# Altium footprint library Cyberdeck.PcbLib: 261 footprints (part 12 of 17)
Each footprint in its own frame and in the unit in brackets; x right, y up, seen from the top. Pads: shape width x height; smd on the part's side, far side on the other; paste and mask are expansions set on the pad; w line width, h text height; cw(c..) or ccw(c..) is an arc to the next point about the centre after c.
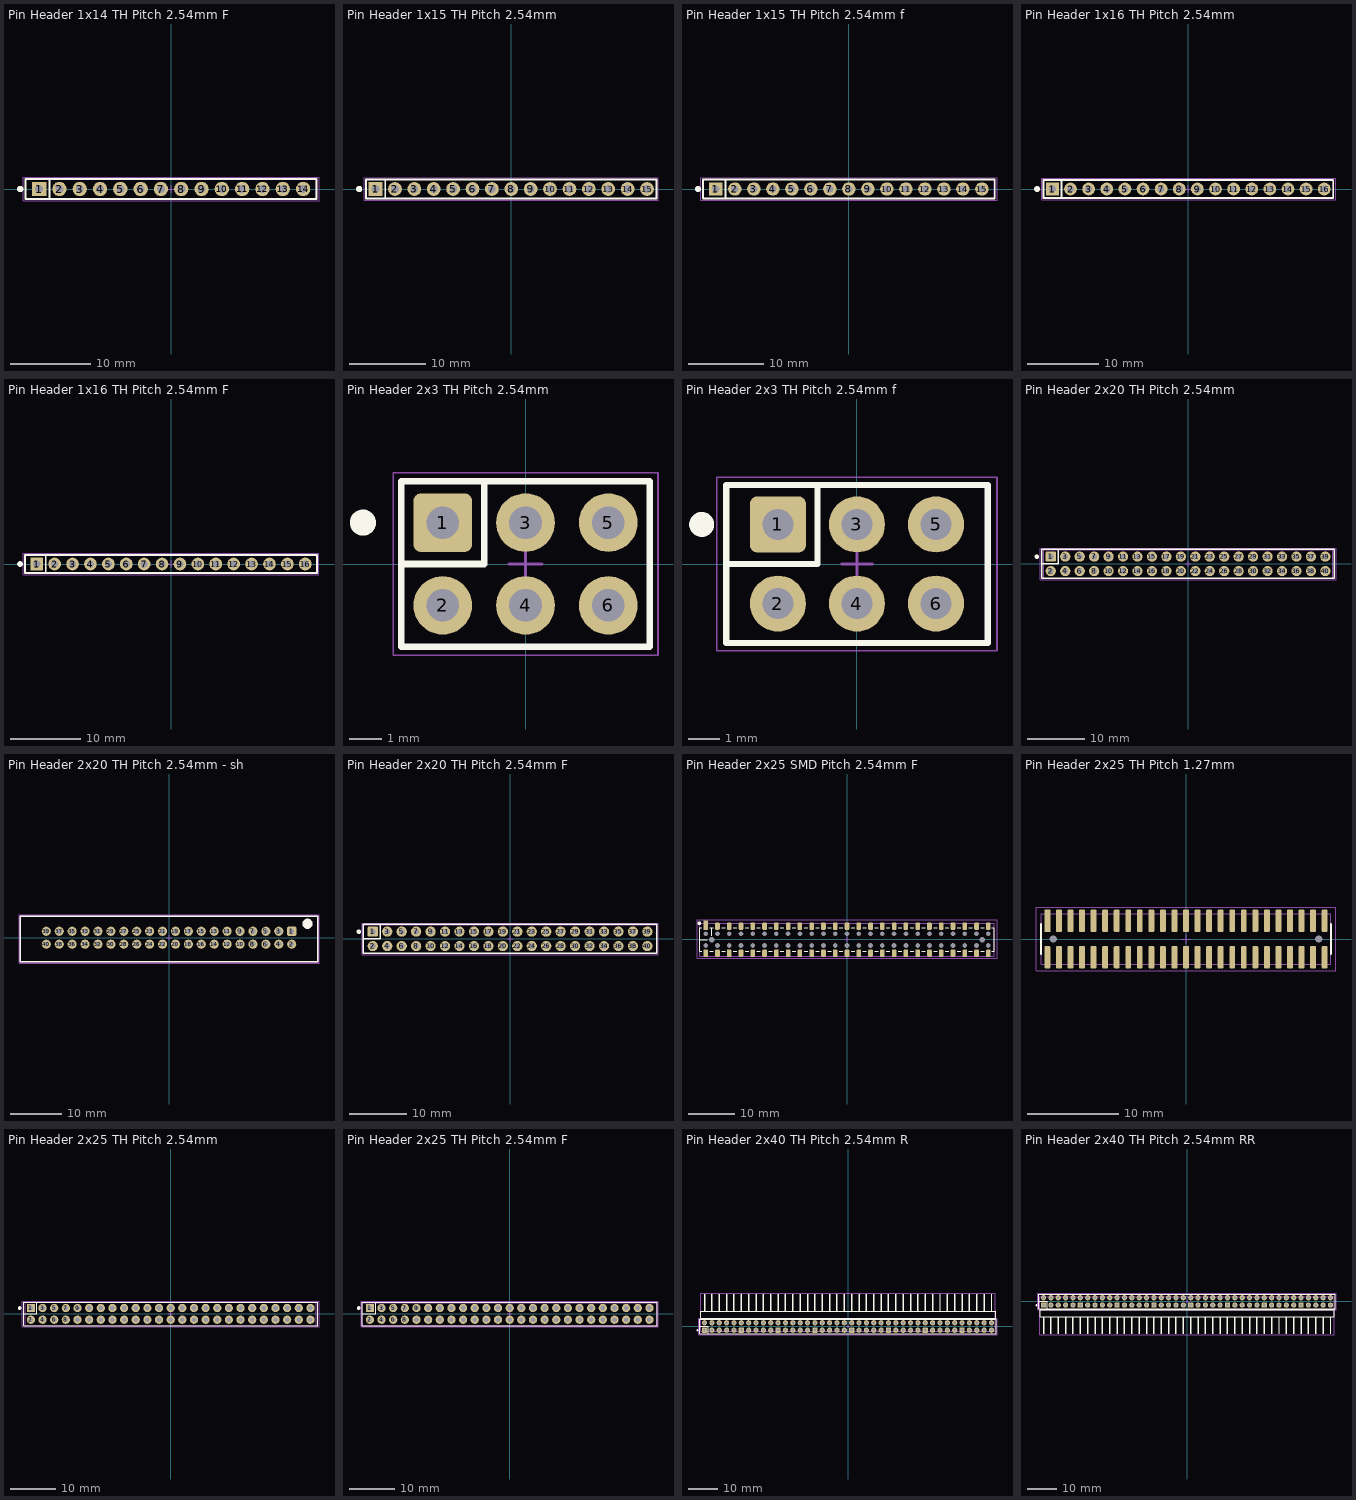
[diagram p11: the footprints below, top view; thin cyan lines are the x and y axes]

## Pin Header 1x14 TH Pitch 2.54mm F [mm] "PinHeader 1x14 TH Pitch 2.54mm female"
height 9.5
pads (14):
  rect 1.8x1.8 hole 1: 1(-16.51,0)
  round 1.8 hole 1: 2(-13.97,0) 3(-11.43,0) 4(-8.89,0) 5(-6.35,0) 6(-3.81,0) 7(-1.27,0) 8(1.27,0) 9(3.81,0) 10(6.35,0) 11(8.89,0) 12(11.43,0) 13(13.97,0) 14(16.51,0)
Top Overlay:
  circle w0.5: c-18.88,0 r0.15
  lines w0.254: -17.78,1.27 18.2,1.27 18.2,-1.27 -18.2,-1.27 -18.2,1.27 -15.24,1.27 -15.24,-1.27
Assembly Top:
  lines w0.1: -18.18,-1.27 18.18,-1.27 18.18,1.27 -18.18,1.27 -18.18,-1.27
Courtyard Top:
  lines w0.05: -18.5,-1.5 -18.5,1.5 18.5,1.5 18.5,-1.5 -18.5,-1.5
  lines w0.1: -0.5,0 0.5,0 ; 0,-0.5 0,0.5
3D body "DS1023-1x7SF11.stp": height 8.5, standoff -3, extent -18.18,-1.27 0.4,1.27
3D body "DS1023-1x7SF11.stp": height 8.5, standoff -3, extent -0.4,-1.27 18.18,1.27

## Pin Header 1x15 TH Pitch 2.54mm [mm] "PinHeader 1x15 TH Pitch 2.54mm"
height 9.5
pads (15):
  rect 1.8x1.8 hole 1: 1(-17.78,0)
  round 1.8 hole 1: 2(-15.24,0) 3(-12.7,0) 4(-10.16,0) 5(-7.62,0) 6(-5.08,0) 7(-2.54,0) 8(0,0) 9(2.54,0) 10(5.08,0) 11(7.62,0) 12(10.16,0) 13(12.7,0) 14(15.24,0) 15(17.78,0)
Top Overlay:
  circle w0.5: c-19.93,0 r0.15
  lines w0.254: -16.51,-1.27 -16.51,1.27 -19.05,1.27 ; -19.05,1.27 -19.05,-1.27 19.05,-1.27 19.05,1.27 -19.05,1.27
Assembly Top:
  lines w0.1: -19.05,-1.27 19.05,-1.27 19.05,1.27 -19.05,1.27 -19.05,-1.27
Courtyard Top:
  lines w0.05: -19.28,-1.5 19.22,-1.5 19.22,1.5 -19.28,1.5 -19.28,-1.5
  lines w0.1: -0.5,0 0.5,0 ; 0,-0.5 0,0.5
3D body "DS1021-1x7SF11.stp": height 8.6, standoff -3, extent -19.05,-1.27 -1.27,1.27
3D body "DS1021-1x8SF11.stp": height 8.6, standoff -3, extent -1.27,-1.27 19.05,1.27

## Pin Header 1x15 TH Pitch 2.54mm f [mm] "PinHeader 1x15 TH Pitch 2.54mm female"
height 9.5
pads (15):
  rect 1.8x1.8 hole 1: 1(-17.78,0)
  round 1.8 hole 1: 2(-15.24,0) 3(-12.7,0) 4(-10.16,0) 5(-7.62,0) 6(-5.08,0) 7(-2.54,0) 8(0,0) 9(2.54,0) 10(5.08,0) 11(7.62,0) 12(10.16,0) 13(12.7,0) 14(15.24,0) 15(17.78,0)
Top Overlay:
  circle w0.5: c-20.15,0 r0.15
  lines w0.254: -19.05,1.27 19.5,1.27 19.5,-1.27 -19.5,-1.27 -19.5,1.27 -16.51,1.27 -16.51,-1.27
Assembly Top:
  lines w0.1: -19.45,-1.27 -19.45,1.27 19.45,1.27 19.45,-1.27 -19.45,-1.27
Courtyard Top:
  lines w0.05: -19.8,-1.5 -19.8,1.5 19.8,1.5 19.8,-1.5 -19.8,-1.5
  lines w0.1: -0.5,0 0.5,0 ; 0,-0.5 0,0.5
3D body "DS1023-1x7SF11.stp": height 8.5, standoff -3, extent -19.45,-1.27 -0.87,1.27
3D body "DS1023-1x8SF11.stp": height 8.5, standoff -3, extent -1.67,-1.27 19.45,1.27

## Pin Header 1x16 TH Pitch 2.54mm [mm] "PinHeader 1x16 TH Pitch 2.54mm"
height 9.5
pads (16):
  rect 1.8x1.8 hole 1: 1(-19.05,0)
  round 1.8 hole 1: 2(-16.51,0) 3(-13.97,0) 4(-11.43,0) 5(-8.89,0) 6(-6.35,0) 7(-3.81,0) 8(-1.27,0) 9(1.27,0) 10(3.81,0) 11(6.35,0) 12(8.89,0) 13(11.43,0) 14(13.97,0) 15(16.51,0) 16(19.05,0)
Top Overlay:
  circle w0.5: c-21.2,0 r0.15
  lines w0.254: -17.78,-1.27 -17.78,1.27 -20.32,1.27 ; -20.32,1.27 -20.32,-1.27 20.32,-1.27 20.32,1.27 -20.32,1.27
Assembly Top:
  lines w0.1: -20.32,-1.27 20.32,-1.27 20.32,1.27 -20.32,1.27 -20.32,-1.27
Courtyard Top:
  lines w0.05: -20.55,-1.5 20.7,-1.5 20.7,1.5 -20.55,1.5 -20.55,-1.5
  lines w0.1: -0.5,0 0.5,0 ; 0,-0.5 0,0.5
3D body "DS1021-1x8SF11.stp": height 8.6, standoff -3, extent -20.32,-1.27 0,1.27
3D body "DS1021-1x8SF11.stp": height 8.6, standoff -3, extent 0,-1.27 20.32,1.27

## Pin Header 1x16 TH Pitch 2.54mm F [mm] "PinHeader 1x16 TH Pitch 2.54mm female"
height 9.5
pads (16):
  rect 1.8x1.8 hole 1: 1(-19.05,0)
  round 1.8 hole 1: 2(-16.51,0) 3(-13.97,0) 4(-11.43,0) 5(-8.89,0) 6(-6.35,0) 7(-3.81,0) 8(-1.27,0) 9(1.27,0) 10(3.81,0) 11(6.35,0) 12(8.89,0) 13(11.43,0) 14(13.97,0) 15(16.51,0) 16(19.05,0)
Top Overlay:
  circle w0.5: c-21.42,0 r0.15
  lines w0.254: -20.32,1.27 20.7,1.27 20.7,-1.27 -20.7,-1.27 -20.7,1.27 -17.78,1.27 -17.78,-1.27
Assembly Top:
  lines w0.1: -20.72,-1.27 20.72,-1.27 20.72,1.27 -20.72,1.27 -20.72,-1.27
Courtyard Top:
  lines w0.05: -21,-1.5 21,-1.5 21,1.5 -21,1.5 -21,-1.5
  lines w0.1: -0.5,0 0.5,0 ; 0,-0.5 0,0.5
3D body "DS1023-1x8SF11.stp": height 8.5, standoff -3, extent -20.72,-1.27 0.4,1.27
3D body "DS1023-1x8SF11.stp": height 8.5, standoff -3, extent -0.4,-1.27 20.72,1.27

## Pin Header 2x3 TH Pitch 2.54mm [mm] "PinHeader 2x3 TH Pitch 2.54mm"
height 9.5
pads (6):
  rrect25% 1.8x1.8 hole 1: 1(-2.54,1.27)
  round 1.8 hole 1: 2(-2.54,-1.27) 3(0,1.27) 4(0,-1.27) 5(2.54,1.27) 6(2.54,-1.27)
Top Overlay:
  circle w0.5: c-4.99,1.27 r0.15
  lines w0.2: -3.81,0 -1.27,0 -1.27,2.54 ; -1.27,2.54 -3.81,2.54 -3.81,-2.54 3.81,-2.54 3.81,2.54 -1.27,2.54
Assembly Top:
  lines w0.1: -3.81,-2.5 -3.81,2.5 3.81,2.5 3.81,-2.5 -3.81,-2.5
Courtyard Top:
  lines w0.05: -4.064,-2.794 4.064,-2.794 4.064,2.794 -4.064,2.794 -4.064,-2.794
  lines w0.1: -0.5,0 0.5,0 ; 0,-0.5 0,0.5
3D body "DS1021-2x3SF11.stp": height 8.6, standoff -3, extent -3.81,-2.5 3.81,2.5

## Pin Header 2x3 TH Pitch 2.54mm f [mm] "PinHeader 2x3 TH Pitch 2.54mm female"
height 9.5
pads (6):
  rrect25% 1.8x1.8 hole 1: 1(-2.54,1.27)
  round 1.8 hole 1: 2(-2.54,-1.27) 3(0,1.27) 4(0,-1.27) 5(2.54,1.27) 6(2.54,-1.27)
Top Overlay:
  circle w0.5: c-4.99,1.27 r0.15
  lines w0.2: -4.2,0 -1.27,0 -1.27,2.54 ; -1.27,2.54 -4.2,2.54 -4.2,-2.54 4.2,-2.54 4.2,2.54 -1.27,2.54
Assembly Top:
  lines w0.1: -4.21,-2.5 4.21,-2.5 4.21,2.5 -4.21,2.5 -4.21,-2.5
Courtyard Top:
  lines w0.05: -4.5,-2.794 4.5,-2.794 4.5,2.794 -4.5,2.794 -4.5,-2.794
  lines w0.1: -0.5,0 0.5,0 ; 0,-0.5 0,0.5
3D body "DS1023-2x3SF11.stp": height 8.5, standoff -3, extent -4.21,-2.5 4.21,2.5

## Pin Header 2x20 TH Pitch 2.54mm [mm] "PinHeader 2x20 TH Pitch 2.54mm"
height 9.5
pads (40):
  rrect25% 1.8x1.8 hole 1: 1(-24.13,1.27)
  round 1.8 hole 1: 2(-24.13,-1.27) 3(-21.59,1.27) 4(-21.59,-1.27) 5(-19.05,1.27) 6(-19.05,-1.27) 7(-16.51,1.27) 8(-16.51,-1.27) 9(-13.97,1.27) 10(-13.97,-1.27) 11(-11.43,1.27) 12(-11.43,-1.27) 13(-8.89,1.27) 14(-8.89,-1.27) 15(-6.35,1.27) 16(-6.35,-1.27) 17(-3.81,1.27) 18(-3.81,-1.27) 19(-1.27,1.27) 20(-1.27,-1.27) 21(1.27,1.27) 22(1.27,-1.27) 23(3.81,1.27) 24(3.81,-1.27) 25(6.35,1.27) 26(6.35,-1.27) 27(8.89,1.27) 28(8.89,-1.27) 29(11.43,1.27) 30(11.43,-1.27) 31(13.97,1.27) 32(13.97,-1.27) 33(16.51,1.27) 34(16.51,-1.27) 35(19.05,1.27) 36(19.05,-1.27) 37(21.59,1.27) 38(21.59,-1.27) 39(24.13,1.27) 40(24.13,-1.27)
Top Overlay:
  circle w0.5: c-26.58,1.27 r0.15
  lines w0.254: -25.6,0 -22.86,0 -22.86,2.54 ; -25.7,-2.54 -25.7,2.54 25.7,2.54 25.7,-2.54 -25.7,-2.54
Assembly Top:
  lines w0.1: -25.4,-2.54 -25.4,2.46 25.4,2.46 25.4,-2.54 -25.4,-2.54
Courtyard Top:
  lines w0.05: -26,-2.83 26,-2.83 26,2.77 -26,2.77 -26,-2.83
  lines w0.1: -0.5,0 0.5,0 ; 0,-0.5 0,0.5
3D body "DS1021-2x20SF11.stp": height 8.61, standoff -2.99, extent -25.4,-2.54 25.4,2.46

## Pin Header 2x20 TH Pitch 2.54mm - sh [mm] "PinHeader 2x20 TH Pitch 2.54mm"
height 9.5
pads (40):
  rrect25% 1.8x1.8 hole 1: 1(24.13,1.27)
  round 1.8 hole 1: 2(24.13,-1.27) 3(21.59,1.27) 4(21.59,-1.27) 5(19.05,1.27) 6(19.05,-1.27) 7(16.51,1.27) 8(16.51,-1.27) 9(13.97,1.27) 10(13.97,-1.27) 11(11.43,1.27) 12(11.43,-1.27) 13(8.89,1.27) 14(8.89,-1.27) 15(6.35,1.27) 16(6.35,-1.27) 17(3.81,1.27) 18(3.81,-1.27) 19(1.27,1.27) 20(1.27,-1.27) 21(-1.27,1.27) 22(-1.27,-1.27) 23(-3.81,1.27) 24(-3.81,-1.27) 25(-6.35,1.27) 26(-6.35,-1.27) 27(-8.89,1.27) 28(-8.89,-1.27) 29(-11.43,1.27) 30(-11.43,-1.27) 31(-13.97,1.27) 32(-13.97,-1.27) 33(-16.51,1.27) 34(-16.51,-1.27) 35(-19.05,1.27) 36(-19.05,-1.27) 37(-21.59,1.27) 38(-21.59,-1.27) 39(-24.13,1.27) 40(-24.13,-1.27)
Top Overlay:
  circle w1: c27.25,2.75 r0.5
  lines w0.254: -29.25,-4.75 29.25,-4.75 29.25,4.25 -29.25,4.25 -29.25,-4.75
Assembly Top:
  lines w0.1: -29.35,-4.75 29.35,-4.75 29.35,4.35 -29.35,4.35 -29.35,-4.75
Courtyard Top:
  lines w0.05: -29.5,-5 -29.5,4.5 29.5,4.5 29.5,-5 -29.5,-5
  lines w0.1: -0.5,0 0.5,0 ; 0,-0.5 0,0.5
3D body "DS1013-40SSiB.stp": height 9.31, standoff -3.09, extent -29.35,-4.74 29.35,4.36

## Pin Header 2x20 TH Pitch 2.54mm F [mm] "PinHeader 2x20 TH Pitch 2.54mm Female"
height 9.5
pads (40):
  rrect25% 1.8x1.8 hole 1: 1(-24.13,1.27)
  round 1.8 hole 1: 2(-24.13,-1.27) 3(-21.59,1.27) 4(-21.59,-1.27) 5(-19.05,1.27) 6(-19.05,-1.27) 7(-16.51,1.27) 8(-16.51,-1.27) 9(-13.97,1.27) 10(-13.97,-1.27) 11(-11.43,1.27) 12(-11.43,-1.27) 13(-8.89,1.27) 14(-8.89,-1.27) 15(-6.35,1.27) 16(-6.35,-1.27) 17(-3.81,1.27) 18(-3.81,-1.27) 19(-1.27,1.27) 20(-1.27,-1.27) 21(1.27,1.27) 22(1.27,-1.27) 23(3.81,1.27) 24(3.81,-1.27) 25(6.35,1.27) 26(6.35,-1.27) 27(8.89,1.27) 28(8.89,-1.27) 29(11.43,1.27) 30(11.43,-1.27) 31(13.97,1.27) 32(13.97,-1.27) 33(16.51,1.27) 34(16.51,-1.27) 35(19.05,1.27) 36(19.05,-1.27) 37(21.59,1.27) 38(21.59,-1.27) 39(24.13,1.27) 40(24.13,-1.27)
Top Overlay:
  circle w0.5: c-26.58,1.27 r0.15
  lines w0.254: -25.8,0 -22.86,0 -22.86,2.54 ; -25.8,-2.54 -25.8,2.54 25.8,2.54 25.8,-2.54 -25.8,-2.54
Assembly Top:
  lines w0.1: -25.8,-2.54 -25.8,2.46 25.8,2.46 25.8,-2.54 -25.8,-2.54
Courtyard Top:
  lines w0.05: -26,-2.83 26,-2.83 26,2.77 -26,2.77 -26,-2.83
  lines w0.1: -0.5,0 0.5,0 ; 0,-0.5 0,0.5
3D body "DS1023-2x20SF11.stp": height 8.51, standoff -2.99, extent -25.8,-2.54 25.8,2.46

## Pin Header 2x25 SMD Pitch 2.54mm F [mm] "PinHeader 2x25 SMD Pitch 2.54mm female"
height 9.5
pads (102):
  rect 1x2 smd: 1(-30.48,3)
  rrect50% 1x1.6 smd: 2(-30.48,-3) 3(-27.94,2.8) 4(-27.94,-3) 5(-25.4,2.8) 6(-25.4,-3) 7(-22.86,2.8) 8(-22.86,-3) 9(-20.32,2.8) 10(-20.32,-3) 11(-17.78,2.8) 12(-17.78,-3) 13(-15.24,2.8) 14(-15.24,-3) 15(-12.7,2.8) 16(-12.7,-3) 17(-10.16,2.8) 18(-10.16,-3) 19(-7.62,2.8) 20(-7.62,-3) 21(-5.08,2.8) 22(-5.08,-3) 23(-2.54,2.8) 24(-2.54,-3) 25(0,2.8) 26(0,-3) 27(2.54,2.8) 28(2.54,-3) 29(5.08,2.8) 30(5.08,-3) 31(7.62,2.8) 32(7.62,-3) 33(10.16,2.8) 34(10.16,-3) 35(12.7,2.8) 36(12.7,-3) 37(15.24,2.8) 38(15.24,-3) 39(17.78,2.8) 40(17.78,-3) 41(20.32,2.8) 42(20.32,-3) 43(22.86,2.8) 44(22.86,-3) 45(25.4,2.8) 46(25.4,-3) 47(27.94,2.8) 48(27.94,-3) 49(30.48,2.8) 50(30.48,-3)
  round 0 hole 1.02 unplated: 51(-30.48,-1.37) 51(-30.48,1.17) 51(-27.94,-1.37) 51(-27.94,1.17) 51(-25.4,-1.37) 51(-25.4,1.17) 51(-22.86,-1.37) 51(-22.86,1.17) 51(-20.32,-1.37) 51(-20.32,1.17) 51(-17.78,-1.37) 51(-17.78,1.17) 51(-15.24,-1.37) 51(-15.24,1.17) 51(-12.7,-1.37) 51(-12.7,1.17) 51(-10.16,-1.37) 51(-10.16,1.17) 51(-7.62,-1.37) 51(-7.62,1.17) 51(-5.08,-1.37) 51(-5.08,1.17) 51(-2.54,-1.37) 51(-2.54,1.17) 51(0,-1.37) 51(0,1.17) 51(2.54,-1.37) 51(2.54,1.17) 51(5.08,-1.37) 51(5.08,1.17) 51(7.62,-1.37) 51(7.62,1.17) 51(10.16,-1.37) 51(10.16,1.17) 51(12.7,-1.37) 51(12.7,1.17) 51(15.24,-1.37) 51(15.24,1.17) 51(17.78,-1.37) 51(17.78,1.17) 51(20.32,-1.37) 51(20.32,1.17) 51(22.86,-1.37) 51(22.86,1.17) 51(25.4,-1.37) 51(25.4,1.17) 51(27.94,-1.37) 51(27.94,1.17) 51(30.48,-1.37) 51(30.48,1.17)
  round 0 hole 1.2 unplated: 51(-29.21,-0.1) 51(29.21,-0.1)
Top Overlay:
  circle w0.5: c-31.877,3.456 r0.15
  lines w0.2: -31.75,-0.1 -30.099,-0.1 ; -31.288,-2.64 -31.75,-2.64 -31.75,2.44 -31.288,2.44 ; -29.591,-2.64 -28.829,-2.64 ; -29.591,2.44 -28.829,2.44 ; -29.21,0.789 -29.21,2.44 ; -27.051,-2.64 -26.289,-2.64 ; -27.051,2.44 -26.289,2.44 ; -24.511,-2.64 -23.749,-2.64 ; -24.511,2.44 -23.749,2.44 ; -21.971,-2.64 -21.209,-2.64 ; -21.971,2.44 -21.209,2.44 ; -19.431,-2.64 -18.669,-2.64 ; -19.431,2.44 -18.669,2.44 ; -16.891,-2.64 -16.129,-2.64 ; -16.891,2.44 -16.129,2.44 ; -14.351,-2.64 -13.589,-2.64 ; -14.351,2.44 -13.589,2.44 ; -11.811,-2.64 -11.049,-2.64 ; -11.811,2.44 -11.049,2.44 ; -9.271,-2.64 -8.509,-2.64 ; -9.271,2.44 -8.509,2.44 ; -6.731,-2.64 -5.969,-2.64 ; -6.731,2.44 -5.969,2.44 ; -4.191,-2.64 -3.429,-2.64 ; -4.191,2.44 -3.429,2.44 ; -1.651,-2.64 -0.889,-2.64 ; -1.651,2.44 -0.889,2.44 ; 0.889,-2.64 1.651,-2.64 ; 0.889,2.44 1.651,2.44 ; 3.429,-2.64 4.191,-2.64 ; 3.429,2.44 4.191,2.44 ; 5.969,-2.64 6.731,-2.64 ; 5.969,2.44 6.731,2.44 ; 8.509,-2.64 9.271,-2.64 ; 8.509,2.44 9.271,2.44 ; 11.049,-2.64 11.811,-2.64 ; 11.049,2.44 11.811,2.44 ; 13.589,-2.64 14.351,-2.64 ; 13.589,2.44 14.351,2.44 ; 16.129,-2.64 16.891,-2.64 ; 16.129,2.44 16.891,2.44 ; 18.669,-2.64 19.431,-2.64 ; 18.669,2.44 19.431,2.44 ; 21.209,-2.64 21.971,-2.64 ; 21.209,2.44 21.971,2.44 ; 23.749,-2.64 24.511,-2.64 ; 23.749,2.44 24.511,2.44 ; 26.289,-2.64 27.051,-2.64 ; 26.289,2.44 27.051,2.44 ; 28.829,-2.64 29.591,-2.64 ; 28.829,2.44 29.591,2.44 ; 31.242,-2.64 31.75,-2.64 31.75,2.44 31.242,2.44
Assembly Top:
  lines w0.1: -31.75,-3.618 -31.75,3.418 31.75,3.418 31.75,-3.618 -31.75,-3.618
Courtyard Top:
  lines w0.05: -32.35,-4.1 32.35,-4.1 32.35,4.2 -32.35,4.2 -32.35,-4.1
  lines w0.1: -0.5,0 0.5,0 ; 0,-0.5 0,0.5
3D body "SSM-125-T-DV-A.stp": height 7.43, standoff -1.21, extent -31.75,-3.618 31.75,3.418
3D body: height 8.6, standoff -3, extent -25.908,11.076 -25.908,11.076

## Pin Header 2x25 TH Pitch 1.27mm [mm] "Pin Header 2x25 TH Pitch 1.27mm"
height 4.7
pads (52):
  rect 0.65x2.5 smd mask+0.051: 1(-15.24,2.006)
  rrect50% 0.65x2.5 smd mask+0.051: 2(-15.24,-2.006) 3(-13.97,2.006) 4(-13.97,-2.006) 5(-12.7,2.006) 6(-12.7,-2.006) 7(-11.43,2.006) 8(-11.43,-2.006) 9(-10.16,2.006) 10(-10.16,-2.006) 11(-8.89,2.006) 12(-8.89,-2.006) 13(-7.62,2.006) 14(-7.62,-2.006) 15(-6.35,2.006) 16(-6.35,-2.006) 17(-5.08,2.006) 18(-5.08,-2.006) 19(-3.81,2.006) 20(-3.81,-2.006) 21(-2.54,2.006) 22(-2.54,-2.006) 23(-1.27,2.006) 24(-1.27,-2.006) 25(0,2.006) 26(0,-2.006) 27(1.27,2.006) 28(1.27,-2.006) 29(2.54,2.006) 30(2.54,-2.006) 31(3.81,2.006) 32(3.81,-2.006) 33(5.08,2.006) 34(5.08,-2.006) 35(6.35,2.006) 36(6.35,-2.006) 37(7.62,2.006) 38(7.62,-2.006) 39(8.89,2.006) 40(8.89,-2.006) 41(10.16,2.006) 42(10.16,-2.006) 43(11.43,2.006) 44(11.43,-2.006) 45(12.7,2.006) 46(12.7,-2.006) 47(13.97,2.006) 48(13.97,-2.006) 49(15.24,2.006) 50(15.24,-2.006)
  round 0 hole 0.8 unplated: 51(-14.605,0) 52(14.605,0)
Top Overlay:
  lines w0.2: -15.932,-1.664 -15.932,1.664 ; 15.932,-1.664 15.932,1.664
Assembly Top:
  lines w0.1: -15.932,-2.75 -15.932,2.75 15.932,2.75 15.932,-2.75 -15.932,-2.75
Courtyard Top:
  lines w0.05: -16.447,-3.5 -16.447,3.5 16.44,3.5 16.44,-3.5 -16.447,-3.5
  lines w0.1: -0.5,0 0.5,0 ; 0,-0.5 0,0.5
3D body "M50-3602542.STEP": height 4.69, standoff 0.01, extent -15.875,-2.75 15.875,2.75

## Pin Header 2x25 TH Pitch 2.54mm [mm] "PinHeader 2x25 TH Pitch 2.54mm"
height 9.5
pads (50):
  rrect25% 1.8x1.8 hole 1: 1(-30.48,1.27)
  round 1.8 hole 1: 2(-30.48,-1.27) 3(-27.94,1.27) 4(-27.94,-1.27) 5(-25.4,1.27) 6(-25.4,-1.27) 7(-22.86,1.27) 8(-22.86,-1.27) 9(-20.32,1.27) 10(-20.32,-1.27) 11(-17.78,1.27) 12(-17.78,-1.27) 13(-15.24,1.27) 14(-15.24,-1.27) 15(-12.7,1.27) 16(-12.7,-1.27) 17(-10.16,1.27) 18(-10.16,-1.27) 19(-7.62,1.27) 20(-7.62,-1.27) 21(-5.08,1.27) 22(-5.08,-1.27) 23(-2.54,1.27) 24(-2.54,-1.27) 25(0,1.27) 26(0,-1.27) 27(2.54,1.27) 28(2.54,-1.27) 29(5.08,1.27) 30(5.08,-1.27) 31(7.62,1.27) 32(7.62,-1.27) 33(10.16,1.27) 34(10.16,-1.27) 35(12.7,1.27) 36(12.7,-1.27) 37(15.24,1.27) 38(15.24,-1.27) 39(17.78,1.27) 40(17.78,-1.27) 41(20.32,1.27) 42(20.32,-1.27) 43(22.86,1.27) 44(22.86,-1.27) 45(25.4,1.27) 46(25.4,-1.27) 47(27.94,1.27) 48(27.94,-1.27) 49(30.48,1.27) 50(30.48,-1.27)
Top Overlay:
  circle w0.5: c-32.93,1.27 r0.15
  lines w0.254: -31.95,0 -29.21,0 -29.21,2.54 ; -32.05,-2.54 32.05,-2.54 32.05,2.55 -32.05,2.55 -32.05,-2.54
Assembly Top:
  lines w0.1: -31.75,-2.54 31.75,-2.5 31.75,2.5 -31.75,2.46 -31.75,-2.54
Courtyard Top:
  lines w0.05: -32.35,-2.83 -32.35,2.77 32.35,2.77 32.35,-2.83 -32.35,-2.83
  lines w0.1: -0.5,0 0.5,0 ; 0,-0.5 0,0.5
3D body "DS1021-2x5SF11.stp": height 8.6, standoff -3, extent 19.05,-2.5 31.75,2.5
3D body "DS1021-2x20SF11.stp": height 8.61, standoff -2.99, extent -31.75,-2.54 19.05,2.46

## Pin Header 2x25 TH Pitch 2.54mm F [mm] "PinHeader 2x20 TH Pitch 2.54mm female"
height 9.5
pads (50):
  rrect25% 1.8x1.8 hole 1: 1(-30.48,1.27)
  round 1.8 hole 1: 2(-30.48,-1.27) 3(-27.94,1.27) 4(-27.94,-1.27) 5(-25.4,1.27) 6(-25.4,-1.27) 7(-22.86,1.27) 8(-22.86,-1.27) 9(-20.32,1.27) 10(-20.32,-1.27) 11(-17.78,1.27) 12(-17.78,-1.27) 13(-15.24,1.27) 14(-15.24,-1.27) 15(-12.7,1.27) 16(-12.7,-1.27) 17(-10.16,1.27) 18(-10.16,-1.27) 19(-7.62,1.27) 20(-7.62,-1.27) 21(-5.08,1.27) 22(-5.08,-1.27) 23(-2.54,1.27) 24(-2.54,-1.27) 25(0,1.27) 26(0,-1.27) 27(2.54,1.27) 28(2.54,-1.27) 29(5.08,1.27) 30(5.08,-1.27) 31(7.62,1.27) 32(7.62,-1.27) 33(10.16,1.27) 34(10.16,-1.27) 35(12.7,1.27) 36(12.7,-1.27) 37(15.24,1.27) 38(15.24,-1.27) 39(17.78,1.27) 40(17.78,-1.27) 41(20.32,1.27) 42(20.32,-1.27) 43(22.86,1.27) 44(22.86,-1.27) 45(25.4,1.27) 46(25.4,-1.27) 47(27.94,1.27) 48(27.94,-1.27) 49(30.48,1.27) 50(30.48,-1.27)
Top Overlay:
  circle w0.5: c-32.93,1.27 r0.15
  lines w0.254: -32.05,0 -29.21,0 -29.21,2.5 ; -32.15,-2.6 -32.15,2.5 32.15,2.5 32.15,-2.6 -32.15,-2.6
Assembly Top:
  lines w0.1: -32.15,-2.54 32.125,-2.55 32.125,2.45 -32.15,2.46 -32.15,-2.54
Courtyard Top:
  lines w0.05: -32.35,-2.83 32.35,-2.83 32.35,2.77 -32.35,2.77 -32.35,-2.83
  lines w0.1: -0.5,0 0.5,0 ; 0,-0.5 0,0.5
3D body "DS1023-2x20SF11.stp": height 8.51, standoff -2.99, extent -32.15,-2.54 19.45,2.46
3D body "DS1023-2x5SF11.stp": height 8.5, standoff -3, extent 18.625,-2.55 32.125,2.45

## Pin Header 2x40 TH Pitch 2.54mm R [mm] "PinHeader 2x40 TH Pitch 2.54mm 90°"
height 9.5
pads (80):
  rrect25% 1.8x1.8 hole 1: 1(-49.53,-1.27) 11(-36.83,-1.27) 21(-24.13,-1.27) 31(-11.43,-1.27) 41(1.27,-1.27) 51(13.97,-1.27) 61(26.67,-1.27) 71(39.37,-1.27)
  round 1.8 hole 1: 2(-49.53,1.27) 3(-46.99,-1.27) 4(-46.99,1.27) 5(-44.45,-1.27) 6(-44.45,1.27) 7(-41.91,-1.27) 8(-41.91,1.27) 9(-39.37,-1.27) 10(-39.37,1.27) 12(-36.83,1.27) 13(-34.29,-1.27) 14(-34.29,1.27) 15(-31.75,-1.27) 16(-31.75,1.27) 17(-29.21,-1.27) 18(-29.21,1.27) 19(-26.67,-1.27) 20(-26.67,1.27) 22(-24.13,1.27) 23(-21.59,-1.27) 24(-21.59,1.27) 25(-19.05,-1.27) 26(-19.05,1.27) 27(-16.51,-1.27) 28(-16.51,1.27) 29(-13.97,-1.27) 30(-13.97,1.27) 32(-11.43,1.27) 33(-8.89,-1.27) 34(-8.89,1.27) 35(-6.35,-1.27) 36(-6.35,1.27) 37(-3.81,-1.27) 38(-3.81,1.27) 39(-1.27,-1.27) 40(-1.27,1.27) 42(1.27,1.27) 43(3.81,-1.27) 44(3.81,1.27) 45(6.35,-1.27) 46(6.35,1.27) 47(8.89,-1.27) 48(8.89,1.27) 49(11.43,-1.27) 50(11.43,1.27) 52(13.97,1.27) 53(16.51,-1.27) 54(16.51,1.27) 55(19.05,-1.27) 56(19.05,1.27) 57(21.59,-1.27) 58(21.59,1.27) 59(24.13,-1.27) 60(24.13,1.27) 62(26.67,1.27) 63(29.21,-1.27) 64(29.21,1.27) 65(31.75,-1.27) 66(31.75,1.27) 67(34.29,-1.27) 68(34.29,1.27) 69(36.83,-1.27) 70(36.83,1.27) 72(39.37,1.27) 73(41.91,-1.27) 74(41.91,1.27) 75(44.45,-1.27) 76(44.45,1.27) 77(46.99,-1.27) 78(46.99,1.27) 79(49.53,-1.27) 80(49.53,1.27)
Top Overlay:
  circle w0.5: c-51.98,-1.27 r0.15
  rectangle: 13.716,5.334 14.224,11.303
  rectangle: 16.256,5.334 16.764,11.303
  rectangle: 18.796,5.334 19.304,11.303
  rectangle: 21.336,5.334 21.844,11.303
  rectangle: 23.876,5.334 24.384,11.303
  region: -13.716,11.303 -14.224,11.303 -14.224,5.334 -13.716,5.334
  region: -16.256,11.303 -16.764,11.303 -16.764,5.334 -16.256,5.334
  region: -18.796,11.303 -19.304,11.303 -19.304,5.334 -18.796,5.334
  region: -21.336,11.303 -21.844,11.303 -21.844,5.334 -21.336,5.334
  region: -23.876,11.303 -24.384,11.303 -24.384,5.334 -23.876,5.334
  region: -26.416,11.303 -26.924,11.303 -26.924,5.334 -26.416,5.334
  region: -28.956,11.303 -29.464,11.303 -29.464,5.334 -28.956,5.334
  region: -31.496,11.303 -32.004,11.303 -32.004,5.334 -31.496,5.334
  region: -34.036,11.303 -34.544,11.303 -34.544,5.334 -34.036,5.334
  region: -36.576,11.303 -37.084,11.303 -37.084,5.334 -36.576,5.334
  region: -39.116,11.303 -39.624,11.303 -39.624,5.334 -39.116,5.334
  region: -41.656,11.303 -42.164,11.303 -42.164,5.334 -41.656,5.334
  region: -44.196,11.303 -44.704,11.303 -44.704,5.334 -44.196,5.334
  region: -46.736,11.303 -47.244,11.303 -47.244,5.334 -46.736,5.334
  region: -49.276,11.303 -49.784,11.303 -49.784,5.334 -49.276,5.334
  rectangle: 1.016,5.334 1.524,11.303
  rectangle: 3.556,5.334 4.064,11.303
  rectangle: 6.096,5.334 6.604,11.303
  rectangle: 8.636,5.334 9.144,11.303
  rectangle: 11.176,5.334 11.684,11.303
  rectangle: -11.684,5.334 -11.176,11.303
  rectangle: -9.144,5.334 -8.636,11.303
  rectangle: -6.604,5.334 -6.096,11.303
  rectangle: -4.064,5.334 -3.556,11.303
  rectangle: -1.524,5.334 -1.016,11.303
  region: 29.464,11.303 28.956,11.303 28.956,5.334 29.464,5.334
  region: 26.924,11.303 26.416,11.303 26.416,5.334 26.924,5.334
  rectangle: 44.196,5.334 44.704,11.303
  rectangle: 46.736,5.334 47.244,11.303
  rectangle: 49.276,5.334 49.784,11.303
  rectangle: 31.496,5.334 32.004,11.303
  rectangle: 34.036,5.334 34.544,11.303
  rectangle: 36.576,5.334 37.084,11.303
  rectangle: 39.116,5.334 39.624,11.303
  rectangle: 41.656,5.334 42.164,11.303
  lines w0.2: -51.19,0 -48.26,0 -48.26,-2.54 ; 51.17,-2.54 -48.26,-2.54 ; 51.19,-2.54 51.19,2.54 -51.19,2.54 -51.19,-2.54 -48.26,-2.54
  lines w0.254: -50.8,2.794 -50.8,5.334 50.8,5.334 50.8,2.794 -50.8,2.794
Assembly Top:
  lines w0.1: -50.825,-1.6 -50.825,11.45 50.8,11.45 50.8,-1.6 -50.825,-1.6
Courtyard Top:
  lines w0.05: -51.5,-2.824 51.43,-2.824 51.43,2.764 -51.5,2.764 -51.5,-2.824
  lines w0.1: -0.5,0 0.5,0 ; 0,-0.5 0,0.5
3D body "DS1022-2x20RF11.stp": height 5, standoff -3, extent -50.8,-1.59 0,11.45
3D body "DS1022-2x20RF11.stp": height 5, standoff -3, extent 0,-1.59 50.8,11.45

## Pin Header 2x40 TH Pitch 2.54mm RR [mm] "PinHeader 2x40 TH Pitch 2.54mm 90°"
height 9.5
pads (80):
  rrect25% 1.8x1.8 hole 1: 1(-49.53,-1.27) 11(-36.83,-1.27) 21(-24.13,-1.27) 31(-11.43,-1.27) 41(1.27,-1.27) 51(13.97,-1.27) 61(26.67,-1.27) 71(39.37,-1.27)
  round 1.8 hole 1: 2(-49.53,1.27) 3(-46.99,-1.27) 4(-46.99,1.27) 5(-44.45,-1.27) 6(-44.45,1.27) 7(-41.91,-1.27) 8(-41.91,1.27) 9(-39.37,-1.27) 10(-39.37,1.27) 12(-36.83,1.27) 13(-34.29,-1.27) 14(-34.29,1.27) 15(-31.75,-1.27) 16(-31.75,1.27) 17(-29.21,-1.27) 18(-29.21,1.27) 19(-26.67,-1.27) 20(-26.67,1.27) 22(-24.13,1.27) 23(-21.59,-1.27) 24(-21.59,1.27) 25(-19.05,-1.27) 26(-19.05,1.27) 27(-16.51,-1.27) 28(-16.51,1.27) 29(-13.97,-1.27) 30(-13.97,1.27) 32(-11.43,1.27) 33(-8.89,-1.27) 34(-8.89,1.27) 35(-6.35,-1.27) 36(-6.35,1.27) 37(-3.81,-1.27) 38(-3.81,1.27) 39(-1.27,-1.27) 40(-1.27,1.27) 42(1.27,1.27) 43(3.81,-1.27) 44(3.81,1.27) 45(6.35,-1.27) 46(6.35,1.27) 47(8.89,-1.27) 48(8.89,1.27) 49(11.43,-1.27) 50(11.43,1.27) 52(13.97,1.27) 53(16.51,-1.27) 54(16.51,1.27) 55(19.05,-1.27) 56(19.05,1.27) 57(21.59,-1.27) 58(21.59,1.27) 59(24.13,-1.27) 60(24.13,1.27) 62(26.67,1.27) 63(29.21,-1.27) 64(29.21,1.27) 65(31.75,-1.27) 66(31.75,1.27) 67(34.29,-1.27) 68(34.29,1.27) 69(36.83,-1.27) 70(36.83,1.27) 72(39.37,1.27) 73(41.91,-1.27) 74(41.91,1.27) 75(44.45,-1.27) 76(44.45,1.27) 77(46.99,-1.27) 78(46.99,1.27) 79(49.53,-1.27) 80(49.53,1.27)
Top Overlay:
  circle w0.5: c-51.98,-1.27 r0.15
  region: -13.716,-5.334 -14.224,-5.334 -14.224,-11.303 -13.716,-11.303
  region: -16.256,-5.334 -16.764,-5.334 -16.764,-11.303 -16.256,-11.303
  region: -18.796,-5.334 -19.304,-5.334 -19.304,-11.303 -18.796,-11.303
  region: -21.336,-5.334 -21.844,-5.334 -21.844,-11.303 -21.336,-11.303
  region: -23.876,-5.334 -24.384,-5.334 -24.384,-11.303 -23.876,-11.303
  rectangle: 13.716,-11.303 14.224,-5.334
  rectangle: 16.256,-11.303 16.764,-5.334
  rectangle: 18.796,-11.303 19.304,-5.334
  rectangle: 21.336,-11.303 21.844,-5.334
  rectangle: 23.876,-11.303 24.384,-5.334
  rectangle: 26.416,-11.303 26.924,-5.334
  rectangle: 28.956,-11.303 29.464,-5.334
  rectangle: 31.496,-11.303 32.004,-5.334
  rectangle: 34.036,-11.303 34.544,-5.334
  rectangle: 36.576,-11.303 37.084,-5.334
  rectangle: 39.116,-11.303 39.624,-5.334
  rectangle: 41.656,-11.303 42.164,-5.334
  rectangle: 44.196,-11.303 44.704,-5.334
  rectangle: 46.736,-11.303 47.244,-5.334
  rectangle: 49.276,-11.303 49.784,-5.334
  region: -1.016,-5.334 -1.524,-5.334 -1.524,-11.303 -1.016,-11.303
  region: -3.556,-5.334 -4.064,-5.334 -4.064,-11.303 -3.556,-11.303
  region: -6.096,-5.334 -6.604,-5.334 -6.604,-11.303 -6.096,-11.303
  region: -8.636,-5.334 -9.144,-5.334 -9.144,-11.303 -8.636,-11.303
  region: -11.176,-5.334 -11.684,-5.334 -11.684,-11.303 -11.176,-11.303
  region: 11.684,-5.334 11.176,-5.334 11.176,-11.303 11.684,-11.303
  region: 9.144,-5.334 8.636,-5.334 8.636,-11.303 9.144,-11.303
  region: 6.604,-5.334 6.096,-5.334 6.096,-11.303 6.604,-11.303
  region: 4.064,-5.334 3.556,-5.334 3.556,-11.303 4.064,-11.303
  region: 1.524,-5.334 1.016,-5.334 1.016,-11.303 1.524,-11.303
  rectangle: -29.464,-11.303 -28.956,-5.334
  rectangle: -26.924,-11.303 -26.416,-5.334
  region: -44.196,-5.334 -44.704,-5.334 -44.704,-11.303 -44.196,-11.303
  region: -46.736,-5.334 -47.244,-5.334 -47.244,-11.303 -46.736,-11.303
  region: -49.276,-5.334 -49.784,-5.334 -49.784,-11.303 -49.276,-11.303
  region: -31.496,-5.334 -32.004,-5.334 -32.004,-11.303 -31.496,-11.303
  region: -34.036,-5.334 -34.544,-5.334 -34.544,-11.303 -34.036,-11.303
  region: -36.576,-5.334 -37.084,-5.334 -37.084,-11.303 -36.576,-11.303
  region: -39.116,-5.334 -39.624,-5.334 -39.624,-11.303 -39.116,-11.303
  region: -41.656,-5.334 -42.164,-5.334 -42.164,-11.303 -41.656,-11.303
  lines w0.2: -51.19,0 -48.26,0 -48.26,-2.54 ; 51.17,-2.54 -48.26,-2.54 ; 51.19,-2.54 51.19,2.54 -51.19,2.54 -51.19,-2.54 -48.26,-2.54
  lines w0.254: -50.8,-5.334 50.8,-5.334 50.8,-2.794 -50.8,-2.794 -50.8,-5.334
Assembly Top:
  lines w0.1: -50.8,-11.45 50.825,-11.45 50.825,1.6 -50.8,1.6 -50.8,-11.45
Courtyard Top:
  lines w0.05: -51.5,-2.824 51.43,-2.824 51.43,2.764 -51.5,2.764 -51.5,-2.824
  lines w0.1: -0.5,0 0.5,0 ; 0,-0.5 0,0.5
3D body "DS1022-2x20RF11.stp": height 5, standoff -3, extent 0,-11.45 50.8,1.59
3D body "DS1022-2x20RF11.stp": height 5, standoff -3, extent -50.8,-11.45 0,1.59